# Altium footprint library ic_sot.PcbLib: 5 footprints
Each footprint in its own frame and in the unit in brackets; x right, y up, seen from the top. Pads: shape width x height; smd on the part's side, far side on the other; paste and mask are expansions set on the pad; w line width, h text height; cw(c..) or ccw(c..) is an arc to the next point about the centre after c.
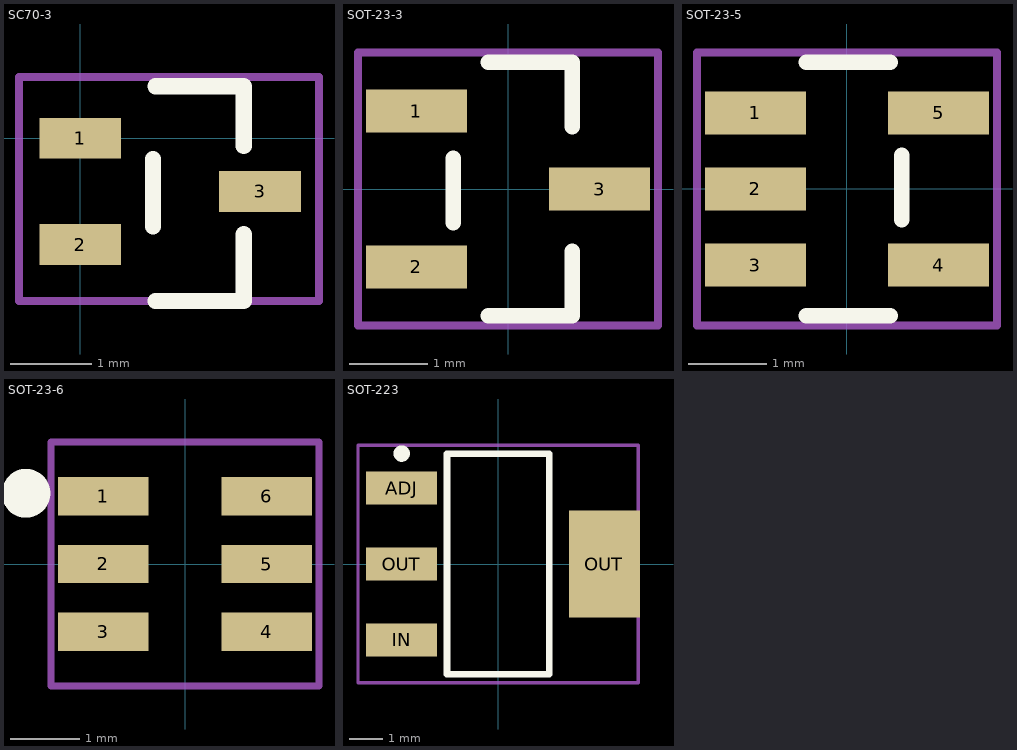
[diagram p0: the footprints below, top view; thin cyan lines are the x and y axes]

## SC70-3 [mm]
height 1.1
pads (3):
  rect 1x0.5 smd: 1(0,0) 2(0,-1.3) 3(2.2,-0.65)
Top Overlay:
  lines w0.2: 0.889,-1.079 0.889,-0.254 ; 0.921,-1.991 2,-1.991 2,-1.175 ; 0.921,0.635 2,0.635 2,-0.095
Mechanical 29:
  lines w0.1: -0.75,-1.991 -0.75,0.749 2.921,0.749 2.921,-1.991 -0.75,-1.991
  text ".Designator" at -0.125,-1.101 h1
3D body "User Library-sc70-3.step": height 1, standoff 0, extent -0.1,-1.7 2.2,0.4

## SOT-23-3 [mm]
height 1.1
pads (3):
  rect 1.3x0.55 smd: 1(-1.175,1.001) 2(-1.175,-1.001) 3(1.175,0)
Top Overlay:
  lines w0.2: -0.7,-0.432 -0.7,0.393 ; -0.254,-1.625 0.825,-1.625 0.825,-0.8 ; -0.254,1.625 0.825,1.625 0.825,0.8
Mechanical 29:
  lines w0.1: -1.925,-1.75 1.925,-1.75 1.925,1.75 -1.925,1.75 -1.925,-1.75
  text ".Designator" at -1.3,-0.1 h1
3D body "SOT-23-3-1.STEP": height 1.1, standoff 0, extent -1.271,-1.5 1.271,1.5

## SOT-23-5 [mm]
height 1.1
pads (5):
  rect 1.3x0.55 smd: 1(-1.175,0.975) 2(-1.175,0) 3(-1.175,-0.975) 4(1.175,-0.975) 5(1.175,0.975)
Top Overlay:
  lines w0.2: -0.525,-1.625 0.554,-1.625 ; -0.525,1.625 0.554,1.625 ; 0.7,-0.393 0.7,0.432
Mechanical 29:
  lines w0.1: -1.925,-1.75 1.925,-1.75 1.925,1.75 -1.925,1.75 -1.925,-1.75
  text ".Designator" at -1.6,-0.2 h1
3D body "SOT-23-5.step": height 1.15, standoff 0.05, extent -1.35,-1.5 1.15,1.5

## SOT-23-6 [mm]
height 1.1
pads (6):
  rect 1.3x0.55 smd: 1(-1.175,0.975) 2(-1.175,0) 3(-1.175,-0.975) 4(1.175,-0.975) 5(1.175,0) 6(1.175,0.975)
Top Overlay:
  circle w0.5: c-2.286,1.016 r0.1
Mechanical 29:
  lines w0.1: -1.925,-1.75 -1.925,1.75 1.925,1.75 1.925,-1.75 -1.925,-1.75
  text ".Designator" at -1.3,-0.227 h1
3D body "SOT-23-6.step": height 1.09, standoff 0, extent -1.213,-1.4 1.213,1.394

## SOT-223 [mm]
height 1.1
pads (4):
  rect 2.15x1 smd: ADJ(-2.925,2.3) IN(-2.925,-2.3) OUT(-2.925,0)
  rect 2.15x3.25 smd: OUT(3.225,0)
Top Overlay:
  circle w0.25: c-2.925,3.35 r0.125
  lines w0.2: -1.55,-3.35 -1.55,3.35 1.55,3.35 1.55,-3.35 -1.55,-3.35
Mechanical 29:
  lines w0.1: -4.25,-3.6 4.25,-3.6 4.25,3.6 -4.25,3.6 -4.25,-3.6
  text ".Designator" at -2.951,0.789 h1
3D body "SOT-223.step": height 1.7, standoff 0.02, extent -3.48,-3.25 3.48,3.25